# Altium integrated library esd_library.IntLib: 995 symbols (part 3 of 6) (continued)
## Resistor_2.74R (continued)
RES SMD 2.74R OHM 1% 1/8W 0805; MPN: CRCW08052R74FKEA; Name: Resistor_2.74R; PN: 541-2.74CCCT-ND; URL: http://www.digikey.ca/product-detail/en/CRCW08052R74FKEA/541-2.74CCCT-ND
footprint RESC2112X05M (Chip Resistor, 2-Leads, Body 2.05x1.25mm, IPC Low Density)
pins: 1, 2

## Resistor_2.80K
designator R?, comment Res3  value 2.80K
RES SMD 2.80K OHM 1% 1/8W 0805; MPN: CRCW08052K80FKEA; Name: Resistor_2.80K; PN: 541-2.80KCCT-ND; URL: http://www.digikey.ca/product-detail/en/CRCW08052K80FKEA/541-2.80KCCT-ND
footprint RESC2112X05M (Chip Resistor, 2-Leads, Body 2.05x1.25mm, IPC Low Density)
pins: 1, 2

## Resistor_2.80M
designator R?, comment Res3  value 2.80M
RES SMD 2.80M OHM 1% 1/8W 0805; MPN: CRCW08052M80FKEA; Name: Resistor_2.80M; PN: 541-2.80MCCT-ND; URL: http://www.digikey.ca/product-detail/en/CRCW08052M80FKEA/541-2.80MCCT-ND
footprint RESC2112X05M (Chip Resistor, 2-Leads, Body 2.05x1.25mm, IPC Low Density)
pins: 1, 2

## Resistor_2.80R
designator R?, comment Res3  value 2.80R
RES SMD 2.80R OHM 1% 1/8W 0805; MPN: CRCW08052R80FKEA; Name: Resistor_2.80R; PN: 541-2.80CCCT-ND; URL: http://www.digikey.ca/product-detail/en/CRCW08052R80FKEA/541-2.80CCCT-ND
footprint RESC2112X05M (Chip Resistor, 2-Leads, Body 2.05x1.25mm, IPC Low Density)
pins: 1, 2

## Resistor_2.87K
designator R?, comment Res3  value 2.87K
RES SMD 2.87K OHM 1% 1/8W 0805; MPN: CRCW08052K87FKEA; Name: Resistor_2.87K; PN: 541-2.87KCCT-ND; URL: http://www.digikey.ca/product-detail/en/CRCW08052K87FKEA/541-2.87KCCT-ND
footprint RESC2112X05M (Chip Resistor, 2-Leads, Body 2.05x1.25mm, IPC Low Density)
pins: 1, 2

## Resistor_2.87M
designator R?, comment Res3  value 2.87M
RES SMD 2.87M OHM 1% 1/8W 0805; MPN: CRCW08052M87FKEA; Name: Resistor_2.87M; PN: 541-2.87MCCT-ND; URL: http://www.digikey.ca/product-detail/en/CRCW08052M87FKEA/541-2.87MCCT-ND
footprint RESC2112X05M (Chip Resistor, 2-Leads, Body 2.05x1.25mm, IPC Low Density)
pins: 1, 2

## Resistor_2.87R
designator R?, comment Res3  value 2.87R
RES SMD 2.87R OHM 1% 1/8W 0805; MPN: CRCW08052R87FKEA; Name: Resistor_2.87R; PN: 541-2.87CCCT-ND; URL: http://www.digikey.ca/product-detail/en/CRCW08052R87FKEA/541-2.87CCCT-ND
footprint RESC2112X05M (Chip Resistor, 2-Leads, Body 2.05x1.25mm, IPC Low Density)
pins: 1, 2

## Resistor_2.94K
designator R?, comment Res3  value 2.94K
RES SMD 2.94K OHM 1% 1/8W 0805; MPN: CRCW08052K94FKEA; Name: Resistor_2.94K; PN: 541-2.94KCCT-ND; URL: http://www.digikey.ca/product-detail/en/CRCW08052K94FKEA/541-2.94KCCT-ND
footprint RESC2112X05M (Chip Resistor, 2-Leads, Body 2.05x1.25mm, IPC Low Density)
pins: 1, 2

## Resistor_2.94M
designator R?, comment Res3  value 2.94M
RES SMD 2.94M OHM 1% 1/8W 0805; MPN: CRCW08052M94FKEA; Name: Resistor_2.94M; PN: 541-2.94MCCT-ND; URL: http://www.digikey.ca/product-detail/en/CRCW08052M94FKEA/541-2.94MCCT-ND
footprint RESC2112X05M (Chip Resistor, 2-Leads, Body 2.05x1.25mm, IPC Low Density)
pins: 1, 2

## Resistor_2.94R
designator R?, comment Res3  value 2.94R
RES SMD 2.94R OHM 1% 1/8W 0805; MPN: CRCW08052R94FKEA; Name: Resistor_2.94R; PN: 541-2.94CCCT-ND; URL: http://www.digikey.ca/product-detail/en/CRCW08052R94FKEA/541-2.94CCCT-ND
footprint RESC2112X05M (Chip Resistor, 2-Leads, Body 2.05x1.25mm, IPC Low Density)
pins: 1, 2

## Resistor_3.01K
designator R?, comment Res3  value 3.01K
RES SMD 3.01K OHM 1% 1/8W 0805; MPN: CRCW08053K01FKEA; Name: Resistor_3.01K; PN: 541-3.01KCCT-ND; URL: http://www.digikey.ca/product-detail/en/CRCW08053K01FKEA/541-3.01KCCT-ND
footprint RESC2112X05M (Chip Resistor, 2-Leads, Body 2.05x1.25mm, IPC Low Density)
pins: 1, 2

## Resistor_3.01M
designator R?, comment Res3  value 3.01M
RES SMD 3.01M OHM 1% 1/8W 0805; MPN: CRCW08053M01FKEA; Name: Resistor_3.01M; PN: 541-3.01MCCT-ND; URL: http://www.digikey.ca/product-detail/en/CRCW08053M01FKEA/541-3.01MCCT-ND
footprint RESC2112X05M (Chip Resistor, 2-Leads, Body 2.05x1.25mm, IPC Low Density)
pins: 1, 2

## Resistor_3.01R
designator R?, comment Res3  value 3.01R
RES SMD 3.01R OHM 1% 1/8W 0805; MPN: CRCW08053R01FKEA; Name: Resistor_3.01R; PN: 541-3.01CCCT-ND; URL: http://www.digikey.ca/product-detail/en/CRCW08053R01FKEA/541-3.01CCCT-ND
footprint RESC2112X05M (Chip Resistor, 2-Leads, Body 2.05x1.25mm, IPC Low Density)
pins: 1, 2

## Resistor_3.09K
designator R?, comment Res3  value 3.09K
RES SMD 3.09K OHM 1% 1/8W 0805; MPN: CRCW08053K09FKEA; Name: Resistor_3.09K; PN: 541-3.09KCCT-ND; URL: http://www.digikey.ca/product-detail/en/CRCW08053K09FKEA/541-3.09KCCT-ND
footprint RESC2112X05M (Chip Resistor, 2-Leads, Body 2.05x1.25mm, IPC Low Density)
pins: 1, 2

## Resistor_3.09M
designator R?, comment Res3  value 3.09M
RES SMD 3.09M OHM 1% 1/8W 0805; MPN: CRCW08053M09FKEA; Name: Resistor_3.09M; PN: 541-3.09MCCT-ND; URL: http://www.digikey.ca/product-detail/en/CRCW08053M09FKEA/541-3.09MCCT-ND
footprint RESC2112X05M (Chip Resistor, 2-Leads, Body 2.05x1.25mm, IPC Low Density)
pins: 1, 2

## Resistor_3.09R
designator R?, comment Res3  value 3.09R
RES SMD 3.09R OHM 1% 1/8W 0805; MPN: CRCW08053R09FKEA; Name: Resistor_3.09R; PN: 541-3.09CCCT-ND; URL: http://www.digikey.ca/product-detail/en/CRCW08053R09FKEA/541-3.09CCCT-ND
footprint RESC2112X05M (Chip Resistor, 2-Leads, Body 2.05x1.25mm, IPC Low Density)
pins: 1, 2

## Resistor_3.16K
designator R?, comment Res3  value 3.16K
RES SMD 3.16K OHM 1% 1/8W 0805; MPN: CRCW08053K16FKEA; Name: Resistor_3.16K; PN: 541-3.16KCCT-ND; URL: http://www.digikey.ca/product-detail/en/CRCW08053K16FKEA/541-3.16KCCT-ND
footprint RESC2112X05M (Chip Resistor, 2-Leads, Body 2.05x1.25mm, IPC Low Density)
pins: 1, 2

## Resistor_3.16M
designator R?, comment Res3  value 3.16M
RES SMD 3.16M OHM 1% 1/8W 0805; MPN: CRCW08053M16FKEA; Name: Resistor_3.16M; PN: 541-3.16MCCT-ND; URL: http://www.digikey.ca/product-detail/en/CRCW08053M16FKEA/541-3.16MCCT-ND
footprint RESC2112X05M (Chip Resistor, 2-Leads, Body 2.05x1.25mm, IPC Low Density)
pins: 1, 2

## Resistor_3.16R
designator R?, comment Res3  value 3.16R
RES SMD 3.16R OHM 1% 1/8W 0805; MPN: CRCW08053R16FKEA; Name: Resistor_3.16R; PN: 541-3.16CCCT-ND; URL: http://www.digikey.ca/product-detail/en/CRCW08053R16FKEA/541-3.16CCCT-ND
footprint RESC2112X05M (Chip Resistor, 2-Leads, Body 2.05x1.25mm, IPC Low Density)
pins: 1, 2

## Resistor_3.24K
designator R?, comment Res3  value 3.24K
RES SMD 3.24K OHM 1% 1/8W 0805; MPN: CRCW08053K24FKEA; Name: Resistor_3.24K; PN: 541-3.24KCCT-ND; URL: http://www.digikey.ca/product-detail/en/CRCW08053K24FKEA/541-3.24KCCT-ND
footprint RESC2112X05M (Chip Resistor, 2-Leads, Body 2.05x1.25mm, IPC Low Density)
pins: 1, 2

## Resistor_3.24M
designator R?, comment Res3  value 3.24M
RES SMD 3.24M OHM 1% 1/8W 0805; MPN: CRCW08053M24FKEA; Name: Resistor_3.24M; PN: 541-3.24MCCT-ND; URL: http://www.digikey.ca/product-detail/en/CRCW08053M24FKEA/541-3.24MCCT-ND
footprint RESC2112X05M (Chip Resistor, 2-Leads, Body 2.05x1.25mm, IPC Low Density)
pins: 1, 2

## Resistor_3.24R
designator R?, comment Res3  value 3.24R
RES SMD 3.24R OHM 1% 1/8W 0805; MPN: CRCW08053R24FKEA; Name: Resistor_3.24R; PN: 541-3.24CCCT-ND; URL: http://www.digikey.ca/product-detail/en/CRCW08053R24FKEA/541-3.24CCCT-ND
footprint RESC2112X05M (Chip Resistor, 2-Leads, Body 2.05x1.25mm, IPC Low Density)
pins: 1, 2

## Resistor_3.32K
designator R?, comment Res3  value 3.32K
RES SMD 3.32K OHM 1% 1/8W 0805; MPN: CRCW08053K32FKEA; Name: Resistor_3.32K; PN: 541-3.32KCCT-ND; URL: http://www.digikey.ca/product-detail/en/CRCW08053K32FKEA/541-3.32KCCT-ND
footprint RESC2112X05M (Chip Resistor, 2-Leads, Body 2.05x1.25mm, IPC Low Density)
pins: 1, 2

## Resistor_3.32M
designator R?, comment Res3  value 3.32M
RES SMD 3.32M OHM 1% 1/8W 0805; MPN: CRCW08053M32FKEA; Name: Resistor_3.32M; PN: 541-3.32MCCT-ND; URL: http://www.digikey.ca/product-detail/en/CRCW08053M32FKEA/541-3.32MCCT-ND
footprint RESC2112X05M (Chip Resistor, 2-Leads, Body 2.05x1.25mm, IPC Low Density)
pins: 1, 2

## Resistor_3.32R
designator R?, comment Res3  value 3.32R
RES SMD 3.32R OHM 1% 1/8W 0805; MPN: CRCW08053R32FKEA; Name: Resistor_3.32R; PN: 541-3.32CCCT-ND; URL: http://www.digikey.ca/product-detail/en/CRCW08053R32FKEA/541-3.32CCCT-ND
footprint RESC2112X05M (Chip Resistor, 2-Leads, Body 2.05x1.25mm, IPC Low Density)
pins: 1, 2

## Resistor_3.40K
designator R?, comment Res3  value 3.40K
RES SMD 3.40K OHM 1% 1/8W 0805; MPN: CRCW08053K40FKEA; Name: Resistor_3.40K; PN: 541-3.40KCCT-ND; URL: http://www.digikey.ca/product-detail/en/CRCW08053K40FKEA/541-3.40KCCT-ND
footprint RESC2112X05M (Chip Resistor, 2-Leads, Body 2.05x1.25mm, IPC Low Density)
pins: 1, 2

## Resistor_3.40M
designator R?, comment Res3  value 3.40M
RES SMD 3.40M OHM 1% 1/8W 0805; MPN: CRCW08053M40FKEA; Name: Resistor_3.40M; PN: 541-3.40MCCT-ND; URL: http://www.digikey.ca/product-detail/en/CRCW08053M40FKEA/541-3.40MCCT-ND
footprint RESC2112X05M (Chip Resistor, 2-Leads, Body 2.05x1.25mm, IPC Low Density)
pins: 1, 2

## Resistor_3.40R
designator R?, comment Res3  value 3.40R
RES SMD 3.40R OHM 1% 1/8W 0805; MPN: CRCW08053R40FKEA; Name: Resistor_3.40R; PN: 541-3.40CCCT-ND; URL: http://www.digikey.ca/product-detail/en/CRCW08053R40FKEA/541-3.40CCCT-ND
footprint RESC2112X05M (Chip Resistor, 2-Leads, Body 2.05x1.25mm, IPC Low Density)
pins: 1, 2

## Resistor_3.48K
designator R?, comment Res3  value 3.48K
RES SMD 3.48K OHM 1% 1/8W 0805; MPN: CRCW08053K48FKEA; Name: Resistor_3.48K; PN: 541-3.48KCCT-ND; URL: http://www.digikey.ca/product-detail/en/CRCW08053K48FKEA/541-3.48KCCT-ND
footprint RESC2112X05M (Chip Resistor, 2-Leads, Body 2.05x1.25mm, IPC Low Density)
pins: 1, 2

## Resistor_3.48M
designator R?, comment Res3  value 3.48M
RES SMD 3.48M OHM 1% 1/8W 0805; MPN: CRCW08053M48FKEA; Name: Resistor_3.48M; PN: 541-3.48MCCT-ND; URL: http://www.digikey.ca/product-detail/en/CRCW08053M48FKEA/541-3.48MCCT-ND
footprint RESC2112X05M (Chip Resistor, 2-Leads, Body 2.05x1.25mm, IPC Low Density)
pins: 1, 2

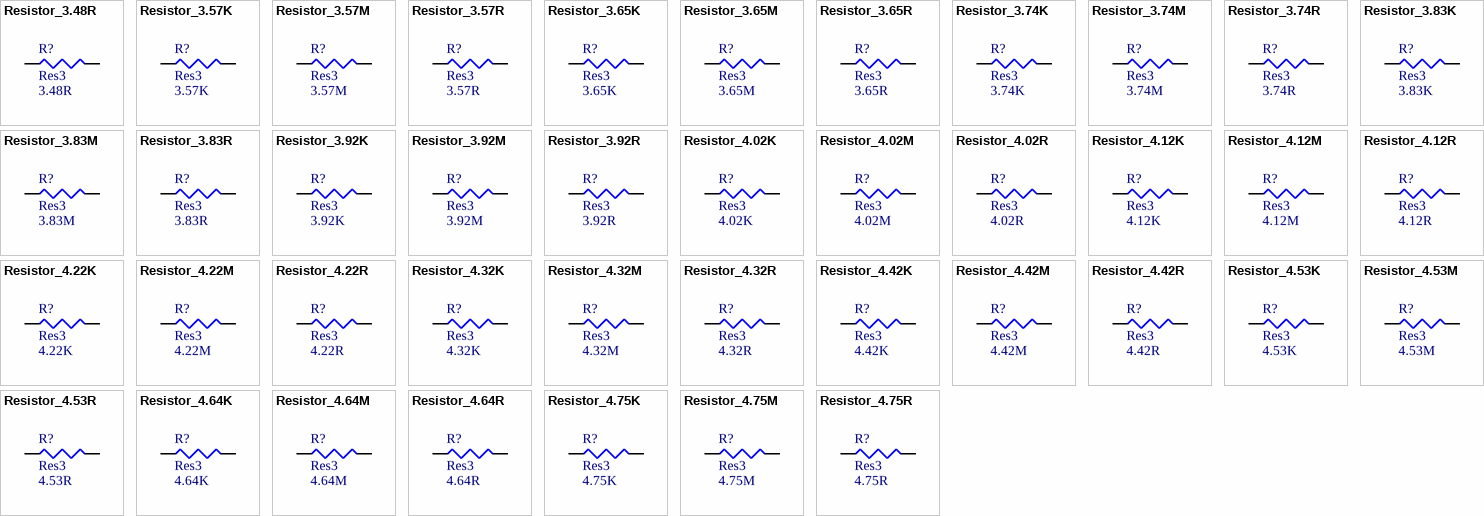
[diagram p15: symbols Resistor_3.48R to Resistor_4.75R]

## Resistor_3.48R
designator R?, comment Res3  value 3.48R
RES SMD 3.48R OHM 1% 1/8W 0805; MPN: CRCW08053R48FKEA; Name: Resistor_3.48R; PN: 541-3.48CCCT-ND; URL: http://www.digikey.ca/product-detail/en/CRCW08053R48FKEA/541-3.48CCCT-ND
footprint RESC2112X05M (Chip Resistor, 2-Leads, Body 2.05x1.25mm, IPC Low Density)
pins: 1, 2

## Resistor_3.57K
designator R?, comment Res3  value 3.57K
RES SMD 3.57K OHM 1% 1/8W 0805; MPN: CRCW08053K57FKEA; Name: Resistor_3.57K; PN: 541-3.57KCCT-ND; URL: http://www.digikey.ca/product-detail/en/CRCW08053K57FKEA/541-3.57KCCT-ND
footprint RESC2112X05M (Chip Resistor, 2-Leads, Body 2.05x1.25mm, IPC Low Density)
pins: 1, 2

## Resistor_3.57M
designator R?, comment Res3  value 3.57M
RES SMD 3.57M OHM 1% 1/8W 0805; MPN: CRCW08053M57FKEA; Name: Resistor_3.57M; PN: 541-3.57MCCT-ND; URL: http://www.digikey.ca/product-detail/en/CRCW08053M57FKEA/541-3.57MCCT-ND
footprint RESC2112X05M (Chip Resistor, 2-Leads, Body 2.05x1.25mm, IPC Low Density)
pins: 1, 2

## Resistor_3.57R
designator R?, comment Res3  value 3.57R
RES SMD 3.57R OHM 1% 1/8W 0805; MPN: CRCW08053R57FKEA; Name: Resistor_3.57R; PN: 541-3.57CCCT-ND; URL: http://www.digikey.ca/product-detail/en/CRCW08053R57FKEA/541-3.57CCCT-ND
footprint RESC2112X05M (Chip Resistor, 2-Leads, Body 2.05x1.25mm, IPC Low Density)
pins: 1, 2

## Resistor_3.65K
designator R?, comment Res3  value 3.65K
RES SMD 3.65K OHM 1% 1/8W 0805; MPN: CRCW08053K65FKEA; Name: Resistor_3.65K; PN: 541-3.65KCCT-ND; URL: http://www.digikey.ca/product-detail/en/CRCW08053K65FKEA/541-3.65KCCT-ND
footprint RESC2112X05M (Chip Resistor, 2-Leads, Body 2.05x1.25mm, IPC Low Density)
pins: 1, 2

## Resistor_3.65M
designator R?, comment Res3  value 3.65M
RES SMD 3.65M OHM 1% 1/8W 0805; MPN: CRCW08053M65FKEA; Name: Resistor_3.65M; PN: 541-3.65MCCT-ND; URL: http://www.digikey.ca/product-detail/en/CRCW08053M65FKEA/541-3.65MCCT-ND
footprint RESC2112X05M (Chip Resistor, 2-Leads, Body 2.05x1.25mm, IPC Low Density)
pins: 1, 2

## Resistor_3.65R
designator R?, comment Res3  value 3.65R
RES SMD 3.65R OHM 1% 1/8W 0805; MPN: CRCW08053R65FKEA; Name: Resistor_3.65R; PN: 541-3.65CCCT-ND; URL: http://www.digikey.ca/product-detail/en/CRCW08053R65FKEA/541-3.65CCCT-ND
footprint RESC2112X05M (Chip Resistor, 2-Leads, Body 2.05x1.25mm, IPC Low Density)
pins: 1, 2

## Resistor_3.74K
designator R?, comment Res3  value 3.74K
RES SMD 3.74K OHM 1% 1/8W 0805; MPN: CRCW08053K74FKEA; Name: Resistor_3.74K; PN: 541-3.74KCCT-ND; URL: http://www.digikey.ca/product-detail/en/CRCW08053K74FKEA/541-3.74KCCT-ND
footprint RESC2112X05M (Chip Resistor, 2-Leads, Body 2.05x1.25mm, IPC Low Density)
pins: 1, 2

## Resistor_3.74M
designator R?, comment Res3  value 3.74M
RES SMD 3.74M OHM 1% 1/8W 0805; MPN: CRCW08053M74FKEA; Name: Resistor_3.74M; PN: 541-3.74MCCT-ND; URL: http://www.digikey.ca/product-detail/en/CRCW08053M74FKEA/541-3.74MCCT-ND
footprint RESC2112X05M (Chip Resistor, 2-Leads, Body 2.05x1.25mm, IPC Low Density)
pins: 1, 2

## Resistor_3.74R
designator R?, comment Res3  value 3.74R
RES SMD 3.74R OHM 1% 1/8W 0805; MPN: CRCW08053R74FKEA; Name: Resistor_3.74R; PN: 541-3.74CCCT-ND; URL: http://www.digikey.ca/product-detail/en/CRCW08053R74FKEA/541-3.74CCCT-ND
footprint RESC2112X05M (Chip Resistor, 2-Leads, Body 2.05x1.25mm, IPC Low Density)
pins: 1, 2

## Resistor_3.83K
designator R?, comment Res3  value 3.83K
RES SMD 3.83K OHM 1% 1/8W 0805; MPN: CRCW08053K83FKEA; Name: Resistor_3.83K; PN: 541-3.83KCCT-ND; URL: http://www.digikey.ca/product-detail/en/CRCW08053K83FKEA/541-3.83KCCT-ND
footprint RESC2112X05M (Chip Resistor, 2-Leads, Body 2.05x1.25mm, IPC Low Density)
pins: 1, 2

## Resistor_3.83M
designator R?, comment Res3  value 3.83M
RES SMD 3.83M OHM 1% 1/8W 0805; MPN: CRCW08053M83FKEA; Name: Resistor_3.83M; PN: 541-3.83MCCT-ND; URL: http://www.digikey.ca/product-detail/en/CRCW08053M83FKEA/541-3.83MCCT-ND
footprint RESC2112X05M (Chip Resistor, 2-Leads, Body 2.05x1.25mm, IPC Low Density)
pins: 1, 2

## Resistor_3.83R
designator R?, comment Res3  value 3.83R
RES SMD 3.83R OHM 1% 1/8W 0805; MPN: CRCW08053R83FKEA; Name: Resistor_3.83R; PN: 541-3.83CCCT-ND; URL: http://www.digikey.ca/product-detail/en/CRCW08053R83FKEA/541-3.83CCCT-ND
footprint RESC2112X05M (Chip Resistor, 2-Leads, Body 2.05x1.25mm, IPC Low Density)
pins: 1, 2

## Resistor_3.92K
designator R?, comment Res3  value 3.92K
RES SMD 3.92K OHM 1% 1/8W 0805; MPN: CRCW08053K92FKEA; Name: Resistor_3.92K; PN: 541-3.92KCCT-ND; URL: http://www.digikey.ca/product-detail/en/CRCW08053K92FKEA/541-3.92KCCT-ND
footprint RESC2112X05M (Chip Resistor, 2-Leads, Body 2.05x1.25mm, IPC Low Density)
pins: 1, 2

## Resistor_3.92M
designator R?, comment Res3  value 3.92M
RES SMD 3.92M OHM 1% 1/8W 0805; MPN: CRCW08053M92FKEA; Name: Resistor_3.92M; PN: 541-3.92MCCT-ND; URL: http://www.digikey.ca/product-detail/en/CRCW08053M92FKEA/541-3.92MCCT-ND
footprint RESC2112X05M (Chip Resistor, 2-Leads, Body 2.05x1.25mm, IPC Low Density)
pins: 1, 2

## Resistor_3.92R
designator R?, comment Res3  value 3.92R
RES SMD 3.92R OHM 1% 1/8W 0805; MPN: CRCW08053R92FKEA; Name: Resistor_3.92R; PN: 541-3.92CCCT-ND; URL: http://www.digikey.ca/product-detail/en/CRCW08053R92FKEA/541-3.92CCCT-ND
footprint RESC2112X05M (Chip Resistor, 2-Leads, Body 2.05x1.25mm, IPC Low Density)
pins: 1, 2

## Resistor_4.02K
designator R?, comment Res3  value 4.02K
RES SMD 4.02K OHM 1% 1/8W 0805; MPN: CRCW08054K02FKEA; Name: Resistor_4.02K; PN: 541-4.02KCCT-ND; URL: http://www.digikey.ca/product-detail/en/CRCW08054K02FKEA/541-4.02KCCT-ND
footprint RESC2112X05M (Chip Resistor, 2-Leads, Body 2.05x1.25mm, IPC Low Density)
pins: 1, 2

## Resistor_4.02M
designator R?, comment Res3  value 4.02M
RES SMD 4.02M OHM 1% 1/8W 0805; MPN: CRCW08054M02FKEA; Name: Resistor_4.02M; PN: 541-4.02MCCT-ND; URL: http://www.digikey.ca/product-detail/en/CRCW08054M02FKEA/541-4.02MCCT-ND
footprint RESC2112X05M (Chip Resistor, 2-Leads, Body 2.05x1.25mm, IPC Low Density)
pins: 1, 2

## Resistor_4.02R
designator R?, comment Res3  value 4.02R
RES SMD 4.02R OHM 1% 1/8W 0805; MPN: CRCW08054R02FKEA; Name: Resistor_4.02R; PN: 541-4.02CCCT-ND; URL: http://www.digikey.ca/product-detail/en/CRCW08054R02FKEA/541-4.02CCCT-ND
footprint RESC2112X05M (Chip Resistor, 2-Leads, Body 2.05x1.25mm, IPC Low Density)
pins: 1, 2

## Resistor_4.12K
designator R?, comment Res3  value 4.12K
RES SMD 4.12K OHM 1% 1/8W 0805; MPN: CRCW08054K12FKEA; Name: Resistor_4.12K; PN: 541-4.12KCCT-ND; URL: http://www.digikey.ca/product-detail/en/CRCW08054K12FKEA/541-4.12KCCT-ND
footprint RESC2112X05M (Chip Resistor, 2-Leads, Body 2.05x1.25mm, IPC Low Density)
pins: 1, 2

## Resistor_4.12M
designator R?, comment Res3  value 4.12M
RES SMD 4.12M OHM 1% 1/8W 0805; MPN: CRCW08054M12FKEA; Name: Resistor_4.12M; PN: 541-4.12MCCT-ND; URL: http://www.digikey.ca/product-detail/en/CRCW08054M12FKEA/541-4.12MCCT-ND
footprint RESC2112X05M (Chip Resistor, 2-Leads, Body 2.05x1.25mm, IPC Low Density)
pins: 1, 2

## Resistor_4.12R
designator R?, comment Res3  value 4.12R
RES SMD 4.12R OHM 1% 1/8W 0805; MPN: CRCW08054R12FKEA; Name: Resistor_4.12R; PN: 541-4.12CCCT-ND; URL: http://www.digikey.ca/product-detail/en/CRCW08054R12FKEA/541-4.12CCCT-ND
footprint RESC2112X05M (Chip Resistor, 2-Leads, Body 2.05x1.25mm, IPC Low Density)
pins: 1, 2

## Resistor_4.22K
designator R?, comment Res3  value 4.22K
RES SMD 4.22K OHM 1% 1/8W 0805; MPN: CRCW08054K22FKEA; Name: Resistor_4.22K; PN: 541-4.22KCCT-ND; URL: http://www.digikey.ca/product-detail/en/CRCW08054K22FKEA/541-4.22KCCT-ND
footprint RESC2112X05M (Chip Resistor, 2-Leads, Body 2.05x1.25mm, IPC Low Density)
pins: 1, 2

## Resistor_4.22M
designator R?, comment Res3  value 4.22M
RES SMD 4.22M OHM 1% 1/8W 0805; MPN: CRCW08054M22FKEA; Name: Resistor_4.22M; PN: 541-4.22MCCT-ND; URL: http://www.digikey.ca/product-detail/en/CRCW08054M22FKEA/541-4.22MCCT-ND
footprint RESC2112X05M (Chip Resistor, 2-Leads, Body 2.05x1.25mm, IPC Low Density)
pins: 1, 2

## Resistor_4.22R
designator R?, comment Res3  value 4.22R
RES SMD 4.22R OHM 1% 1/8W 0805; MPN: CRCW08054R22FKEA; Name: Resistor_4.22R; PN: 541-4.22CCCT-ND; URL: http://www.digikey.ca/product-detail/en/CRCW08054R22FKEA/541-4.22CCCT-ND
footprint RESC2112X05M (Chip Resistor, 2-Leads, Body 2.05x1.25mm, IPC Low Density)
pins: 1, 2

## Resistor_4.32K
designator R?, comment Res3  value 4.32K
RES SMD 4.32K OHM 1% 1/8W 0805; MPN: CRCW08054K32FKEA; Name: Resistor_4.32K; PN: 541-4.32KCCT-ND; URL: http://www.digikey.ca/product-detail/en/CRCW08054K32FKEA/541-4.32KCCT-ND
footprint RESC2112X05M (Chip Resistor, 2-Leads, Body 2.05x1.25mm, IPC Low Density)
pins: 1, 2

## Resistor_4.32M
designator R?, comment Res3  value 4.32M
RES SMD 4.32M OHM 1% 1/8W 0805; MPN: CRCW08054M32FKEA; Name: Resistor_4.32M; PN: 541-4.32MCCT-ND; URL: http://www.digikey.ca/product-detail/en/CRCW08054M32FKEA/541-4.32MCCT-ND
footprint RESC2112X05M (Chip Resistor, 2-Leads, Body 2.05x1.25mm, IPC Low Density)
pins: 1, 2

## Resistor_4.32R
designator R?, comment Res3  value 4.32R
RES SMD 4.32R OHM 1% 1/8W 0805; MPN: CRCW08054R32FKEA; Name: Resistor_4.32R; PN: 541-4.32CCCT-ND; URL: http://www.digikey.ca/product-detail/en/CRCW08054R32FKEA/541-4.32CCCT-ND
footprint RESC2112X05M (Chip Resistor, 2-Leads, Body 2.05x1.25mm, IPC Low Density)
pins: 1, 2

## Resistor_4.42K
designator R?, comment Res3  value 4.42K
RES SMD 4.42K OHM 1% 1/8W 0805; MPN: CRCW08054K42FKEA; Name: Resistor_4.42K; PN: 541-4.42KCCT-ND; URL: http://www.digikey.ca/product-detail/en/CRCW08054K42FKEA/541-4.42KCCT-ND
footprint RESC2112X05M (Chip Resistor, 2-Leads, Body 2.05x1.25mm, IPC Low Density)
pins: 1, 2

## Resistor_4.42M
designator R?, comment Res3  value 4.42M
RES SMD 4.42M OHM 1% 1/8W 0805; MPN: CRCW08054M42FKEA; Name: Resistor_4.42M; PN: 541-4.42MCCT-ND; URL: http://www.digikey.ca/product-detail/en/CRCW08054M42FKEA/541-4.42MCCT-ND
footprint RESC2112X05M (Chip Resistor, 2-Leads, Body 2.05x1.25mm, IPC Low Density)
pins: 1, 2

## Resistor_4.42R
designator R?, comment Res3  value 4.42R
RES SMD 4.42R OHM 1% 1/8W 0805; MPN: CRCW08054R42FKEA; Name: Resistor_4.42R; PN: 541-4.42CCCT-ND; URL: http://www.digikey.ca/product-detail/en/CRCW08054R42FKEA/541-4.42CCCT-ND
footprint RESC2112X05M (Chip Resistor, 2-Leads, Body 2.05x1.25mm, IPC Low Density)
pins: 1, 2

## Resistor_4.53K
designator R?, comment Res3  value 4.53K
RES SMD 4.53K OHM 1% 1/8W 0805; MPN: CRCW08054K53FKEA; Name: Resistor_4.53K; PN: 541-4.53KCCT-ND; URL: http://www.digikey.ca/product-detail/en/CRCW08054K53FKEA/541-4.53KCCT-ND
footprint RESC2112X05M (Chip Resistor, 2-Leads, Body 2.05x1.25mm, IPC Low Density)
pins: 1, 2

## Resistor_4.53M
designator R?, comment Res3  value 4.53M
RES SMD 4.53M OHM 1% 1/8W 0805; MPN: CRCW08054M53FKEA; Name: Resistor_4.53M; PN: 541-4.53MCCT-ND; URL: http://www.digikey.ca/product-detail/en/CRCW08054M53FKEA/541-4.53MCCT-ND
footprint RESC2112X05M (Chip Resistor, 2-Leads, Body 2.05x1.25mm, IPC Low Density)
pins: 1, 2

## Resistor_4.53R
designator R?, comment Res3  value 4.53R
RES SMD 4.53R OHM 1% 1/8W 0805; MPN: CRCW08054R53FKEA; Name: Resistor_4.53R; PN: 541-4.53CCCT-ND; URL: http://www.digikey.ca/product-detail/en/CRCW08054R53FKEA/541-4.53CCCT-ND
footprint RESC2112X05M (Chip Resistor, 2-Leads, Body 2.05x1.25mm, IPC Low Density)
pins: 1, 2

## Resistor_4.64K
designator R?, comment Res3  value 4.64K
RES SMD 4.64K OHM 1% 1/8W 0805; MPN: CRCW08054K64FKEA; Name: Resistor_4.64K; PN: 541-4.64KCCT-ND; URL: http://www.digikey.ca/product-detail/en/CRCW08054K64FKEA/541-4.64KCCT-ND
footprint RESC2112X05M (Chip Resistor, 2-Leads, Body 2.05x1.25mm, IPC Low Density)
pins: 1, 2

## Resistor_4.64M
designator R?, comment Res3  value 4.64M
RES SMD 4.64M OHM 1% 1/8W 0805; MPN: CRCW08054M64FKEA; Name: Resistor_4.64M; PN: 541-4.64MCCT-ND; URL: http://www.digikey.ca/product-detail/en/CRCW08054M64FKEA/541-4.64MCCT-ND
footprint RESC2112X05M (Chip Resistor, 2-Leads, Body 2.05x1.25mm, IPC Low Density)
pins: 1, 2

## Resistor_4.64R
designator R?, comment Res3  value 4.64R
RES SMD 4.64R OHM 1% 1/8W 0805; MPN: CRCW08054R64FKEA; Name: Resistor_4.64R; PN: 541-4.64CCCT-ND; URL: http://www.digikey.ca/product-detail/en/CRCW08054R64FKEA/541-4.64CCCT-ND
footprint RESC2112X05M (Chip Resistor, 2-Leads, Body 2.05x1.25mm, IPC Low Density)
pins: 1, 2

## Resistor_4.75K
designator R?, comment Res3  value 4.75K
RES SMD 4.75K OHM 1% 1/8W 0805; MPN: CRCW08054K75FKEA; Name: Resistor_4.75K; PN: 541-4.75KCCT-ND; URL: http://www.digikey.ca/product-detail/en/CRCW08054K75FKEA/541-4.75KCCT-ND
footprint RESC2112X05M (Chip Resistor, 2-Leads, Body 2.05x1.25mm, IPC Low Density)
pins: 1, 2

## Resistor_4.75M
designator R?, comment Res3  value 4.75M
RES SMD 4.75M OHM 1% 1/8W 0805; MPN: CRCW08054M75FKEA; Name: Resistor_4.75M; PN: 541-4.75MCCT-ND; URL: http://www.digikey.ca/product-detail/en/CRCW08054M75FKEA/541-4.75MCCT-ND
footprint RESC2112X05M (Chip Resistor, 2-Leads, Body 2.05x1.25mm, IPC Low Density)
pins: 1, 2

## Resistor_4.75R
designator R?, comment Res3  value 4.75R
RES SMD 4.75R OHM 1% 1/8W 0805; MPN: CRCW08054R75FKEA; Name: Resistor_4.75R; PN: 541-4.75CCCT-ND; URL: http://www.digikey.ca/product-detail/en/CRCW08054R75FKEA/541-4.75CCCT-ND
footprint RESC2112X05M (Chip Resistor, 2-Leads, Body 2.05x1.25mm, IPC Low Density)
pins: 1, 2

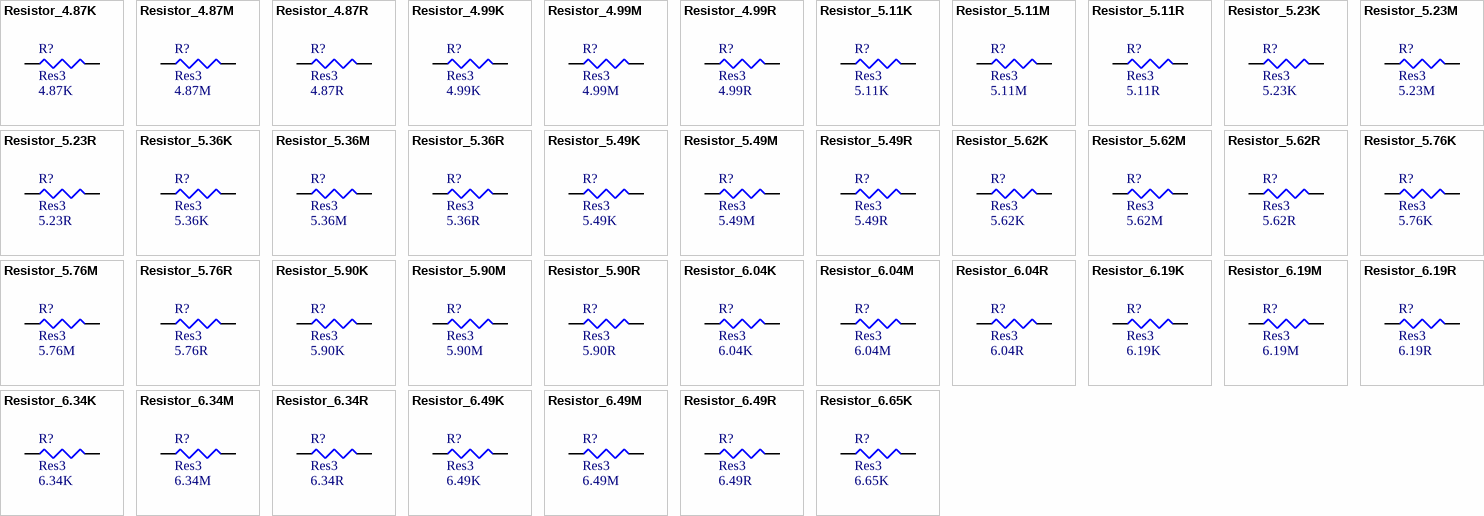
[diagram p16: symbols Resistor_4.87K to Resistor_6.65K]

## Resistor_4.87K
designator R?, comment Res3  value 4.87K
RES SMD 4.87K OHM 1% 1/8W 0805; MPN: CRCW08054K87FKEA; Name: Resistor_4.87K; PN: 541-4.87KCCT-ND; URL: http://www.digikey.ca/product-detail/en/CRCW08054K87FKEA/541-4.87KCCT-ND
footprint RESC2112X05M (Chip Resistor, 2-Leads, Body 2.05x1.25mm, IPC Low Density)
pins: 1, 2

## Resistor_4.87M
designator R?, comment Res3  value 4.87M
RES SMD 4.87M OHM 1% 1/8W 0805; MPN: CRCW08054M87FKEA; Name: Resistor_4.87M; PN: 541-4.87MCCT-ND; URL: http://www.digikey.ca/product-detail/en/CRCW08054M87FKEA/541-4.87MCCT-ND
footprint RESC2112X05M (Chip Resistor, 2-Leads, Body 2.05x1.25mm, IPC Low Density)
pins: 1, 2

## Resistor_4.87R
designator R?, comment Res3  value 4.87R
RES SMD 4.87R OHM 1% 1/8W 0805; MPN: CRCW08054R87FKEA; Name: Resistor_4.87R; PN: 541-4.87CCCT-ND; URL: http://www.digikey.ca/product-detail/en/CRCW08054R87FKEA/541-4.87CCCT-ND
footprint RESC2112X05M (Chip Resistor, 2-Leads, Body 2.05x1.25mm, IPC Low Density)
pins: 1, 2

## Resistor_4.99K
designator R?, comment Res3  value 4.99K
RES SMD 4.99K OHM 1% 1/8W 0805; MPN: CRCW08054K99FKEA; Name: Resistor_4.99K; PN: 541-4.99KCCT-ND; URL: http://www.digikey.ca/product-detail/en/CRCW08054K99FKEA/541-4.99KCCT-ND
footprint RESC2112X05M (Chip Resistor, 2-Leads, Body 2.05x1.25mm, IPC Low Density)
pins: 1, 2

## Resistor_4.99M
designator R?, comment Res3  value 4.99M
RES SMD 4.99M OHM 1% 1/8W 0805; MPN: CRCW08054M99FKEA; Name: Resistor_4.99M; PN: 541-4.99MCCT-ND; URL: http://www.digikey.ca/product-detail/en/CRCW08054M99FKEA/541-4.99MCCT-ND
footprint RESC2112X05M (Chip Resistor, 2-Leads, Body 2.05x1.25mm, IPC Low Density)
pins: 1, 2

## Resistor_4.99R
designator R?, comment Res3  value 4.99R
RES SMD 4.99R OHM 1% 1/8W 0805; MPN: CRCW08054R99FKEA; Name: Resistor_4.99R; PN: 541-4.99CCCT-ND; URL: http://www.digikey.ca/product-detail/en/CRCW08054R99FKEA/541-4.99CCCT-ND
footprint RESC2112X05M (Chip Resistor, 2-Leads, Body 2.05x1.25mm, IPC Low Density)
pins: 1, 2

## Resistor_5.11K
designator R?, comment Res3  value 5.11K
RES SMD 5.11K OHM 1% 1/8W 0805; MPN: CRCW08055K11FKEA; Name: Resistor_5.11K; PN: 541-5.11KCCT-ND; URL: http://www.digikey.ca/product-detail/en/CRCW08055K11FKEA/541-5.11KCCT-ND
footprint RESC2112X05M (Chip Resistor, 2-Leads, Body 2.05x1.25mm, IPC Low Density)
pins: 1, 2

## Resistor_5.11M
designator R?, comment Res3  value 5.11M
RES SMD 5.11M OHM 1% 1/8W 0805; MPN: CRCW08055M11FKEA; Name: Resistor_5.11M; PN: 541-5.11MCCT-ND; URL: http://www.digikey.ca/product-detail/en/CRCW08055M11FKEA/541-5.11MCCT-ND
footprint RESC2112X05M (Chip Resistor, 2-Leads, Body 2.05x1.25mm, IPC Low Density)
pins: 1, 2

## Resistor_5.11R
designator R?, comment Res3  value 5.11R
RES SMD 5.11R OHM 1% 1/8W 0805; MPN: CRCW08055R11FKEA; Name: Resistor_5.11R; PN: 541-5.11CCCT-ND; URL: http://www.digikey.ca/product-detail/en/CRCW08055R11FKEA/541-5.11CCCT-ND
footprint RESC2112X05M (Chip Resistor, 2-Leads, Body 2.05x1.25mm, IPC Low Density)
pins: 1, 2

## Resistor_5.23K
designator R?, comment Res3  value 5.23K
RES SMD 5.23K OHM 1% 1/8W 0805; MPN: CRCW08055K23FKEA; Name: Resistor_5.23K; PN: 541-5.23KCCT-ND; URL: http://www.digikey.ca/product-detail/en/CRCW08055K23FKEA/541-5.23KCCT-ND
footprint RESC2112X05M (Chip Resistor, 2-Leads, Body 2.05x1.25mm, IPC Low Density)
pins: 1, 2

## Resistor_5.23M
designator R?, comment Res3  value 5.23M
RES SMD 5.23M OHM 1% 1/8W 0805; MPN: CRCW08055M23FKEA; Name: Resistor_5.23M; PN: 541-5.23MCCT-ND; URL: http://www.digikey.ca/product-detail/en/CRCW08055M23FKEA/541-5.23MCCT-ND
footprint RESC2112X05M (Chip Resistor, 2-Leads, Body 2.05x1.25mm, IPC Low Density)
pins: 1, 2

## Resistor_5.23R
designator R?, comment Res3  value 5.23R
RES SMD 5.23R OHM 1% 1/8W 0805; MPN: CRCW08055R23FKEA; Name: Resistor_5.23R; PN: 541-5.23CCCT-ND; URL: http://www.digikey.ca/product-detail/en/CRCW08055R23FKEA/541-5.23CCCT-ND
footprint RESC2112X05M (Chip Resistor, 2-Leads, Body 2.05x1.25mm, IPC Low Density)
pins: 1, 2

## Resistor_5.36K
designator R?, comment Res3  value 5.36K
RES SMD 5.36K OHM 1% 1/8W 0805; MPN: CRCW08055K36FKEA; Name: Resistor_5.36K; PN: 541-5.36KCCT-ND; URL: http://www.digikey.ca/product-detail/en/CRCW08055K36FKEA/541-5.36KCCT-ND
footprint RESC2112X05M (Chip Resistor, 2-Leads, Body 2.05x1.25mm, IPC Low Density)
pins: 1, 2

## Resistor_5.36M
designator R?, comment Res3  value 5.36M
RES SMD 5.36M OHM 1% 1/8W 0805; MPN: CRCW08055M36FKEA; Name: Resistor_5.36M; PN: 541-5.36MCCT-ND; URL: http://www.digikey.ca/product-detail/en/CRCW08055M36FKEA/541-5.36MCCT-ND
footprint RESC2112X05M (Chip Resistor, 2-Leads, Body 2.05x1.25mm, IPC Low Density)
pins: 1, 2

## Resistor_5.36R
designator R?, comment Res3  value 5.36R
RES SMD 5.36R OHM 1% 1/8W 0805; MPN: CRCW08055R36FKEA; Name: Resistor_5.36R; PN: 541-5.36CCCT-ND; URL: http://www.digikey.ca/product-detail/en/CRCW08055R36FKEA/541-5.36CCCT-ND
footprint RESC2112X05M (Chip Resistor, 2-Leads, Body 2.05x1.25mm, IPC Low Density)
pins: 1, 2

## Resistor_5.49K
designator R?, comment Res3  value 5.49K
RES SMD 5.49K OHM 1% 1/8W 0805; MPN: CRCW08055K49FKEA; Name: Resistor_5.49K; PN: 541-5.49KCCT-ND; URL: http://www.digikey.ca/product-detail/en/CRCW08055K49FKEA/541-5.49KCCT-ND
footprint RESC2112X05M (Chip Resistor, 2-Leads, Body 2.05x1.25mm, IPC Low Density)
pins: 1, 2

## Resistor_5.49M
designator R?, comment Res3  value 5.49M
RES SMD 5.49M OHM 1% 1/8W 0805; MPN: CRCW08055M49FKEA; Name: Resistor_5.49M; PN: 541-5.49MCCT-ND; URL: http://www.digikey.ca/product-detail/en/CRCW08055M49FKEA/541-5.49MCCT-ND
footprint RESC2112X05M (Chip Resistor, 2-Leads, Body 2.05x1.25mm, IPC Low Density)
pins: 1, 2

## Resistor_5.49R
designator R?, comment Res3  value 5.49R
RES SMD 5.49R OHM 1% 1/8W 0805; MPN: CRCW08055R49FKEA; Name: Resistor_5.49R; PN: 541-5.49CCCT-ND; URL: http://www.digikey.ca/product-detail/en/CRCW08055R49FKEA/541-5.49CCCT-ND
footprint RESC2112X05M (Chip Resistor, 2-Leads, Body 2.05x1.25mm, IPC Low Density)
pins: 1, 2

## Resistor_5.62K
designator R?, comment Res3  value 5.62K
RES SMD 5.62K OHM 1% 1/8W 0805; MPN: CRCW08055K62FKEA; Name: Resistor_5.62K; PN: 541-5.62KCCT-ND; URL: http://www.digikey.ca/product-detail/en/CRCW08055K62FKEA/541-5.62KCCT-ND
footprint RESC2112X05M (Chip Resistor, 2-Leads, Body 2.05x1.25mm, IPC Low Density)
pins: 1, 2

## Resistor_5.62M
designator R?, comment Res3  value 5.62M
RES SMD 5.62M OHM 1% 1/8W 0805; MPN: CRCW08055M62FKEA; Name: Resistor_5.62M; PN: 541-5.62MCCT-ND; URL: http://www.digikey.ca/product-detail/en/CRCW08055M62FKEA/541-5.62MCCT-ND
footprint RESC2112X05M (Chip Resistor, 2-Leads, Body 2.05x1.25mm, IPC Low Density)
pins: 1, 2

## Resistor_5.62R
designator R?, comment Res3  value 5.62R
RES SMD 5.62R OHM 1% 1/8W 0805; MPN: CRCW08055R62FKEA; Name: Resistor_5.62R; PN: 541-5.62CCCT-ND; URL: http://www.digikey.ca/product-detail/en/CRCW08055R62FKEA/541-5.62CCCT-ND
footprint RESC2112X05M (Chip Resistor, 2-Leads, Body 2.05x1.25mm, IPC Low Density)
pins: 1, 2

## Resistor_5.76K
designator R?, comment Res3  value 5.76K
RES SMD 5.76K OHM 1% 1/8W 0805; MPN: CRCW08055K76FKEA; Name: Resistor_5.76K; PN: 541-5.76KCCT-ND; URL: http://www.digikey.ca/product-detail/en/CRCW08055K76FKEA/541-5.76KCCT-ND
footprint RESC2112X05M (Chip Resistor, 2-Leads, Body 2.05x1.25mm, IPC Low Density)
pins: 1, 2

## Resistor_5.76M
designator R?, comment Res3  value 5.76M
RES SMD 5.76M OHM 1% 1/8W 0805; MPN: CRCW08055M76FKEA; Name: Resistor_5.76M; PN: 541-5.76MCCT-ND; URL: http://www.digikey.ca/product-detail/en/CRCW08055M76FKEA/541-5.76MCCT-ND
footprint RESC2112X05M (Chip Resistor, 2-Leads, Body 2.05x1.25mm, IPC Low Density)
pins: 1, 2

## Resistor_5.76R
designator R?, comment Res3  value 5.76R
RES SMD 5.76R OHM 1% 1/8W 0805; MPN: CRCW08055R76FKEA; Name: Resistor_5.76R; PN: 541-5.76CCCT-ND; URL: http://www.digikey.ca/product-detail/en/CRCW08055R76FKEA/541-5.76CCCT-ND
footprint RESC2112X05M (Chip Resistor, 2-Leads, Body 2.05x1.25mm, IPC Low Density)
pins: 1, 2

## Resistor_5.90K
designator R?, comment Res3  value 5.90K
RES SMD 5.90K OHM 1% 1/8W 0805; MPN: CRCW08055K90FKEA; Name: Resistor_5.90K; PN: 541-5.90KCCT-ND; URL: http://www.digikey.ca/product-detail/en/CRCW08055K90FKEA/541-5.90KCCT-ND
footprint RESC2112X05M (Chip Resistor, 2-Leads, Body 2.05x1.25mm, IPC Low Density)
pins: 1, 2

## Resistor_5.90M
designator R?, comment Res3  value 5.90M
RES SMD 5.90M OHM 1% 1/8W 0805; MPN: CRCW08055M90FKEA; Name: Resistor_5.90M; PN: 541-5.90MCCT-ND; URL: http://www.digikey.ca/product-detail/en/CRCW08055M90FKEA/541-5.90MCCT-ND
footprint RESC2112X05M (Chip Resistor, 2-Leads, Body 2.05x1.25mm, IPC Low Density)
pins: 1, 2

## Resistor_5.90R
designator R?, comment Res3  value 5.90R
RES SMD 5.90R OHM 1% 1/8W 0805; MPN: CRCW08055R90FKEA; Name: Resistor_5.90R; PN: 541-5.90CCCT-ND; URL: http://www.digikey.ca/product-detail/en/CRCW08055R90FKEA/541-5.90CCCT-ND
footprint RESC2112X05M (Chip Resistor, 2-Leads, Body 2.05x1.25mm, IPC Low Density)
pins: 1, 2

## Resistor_6.04K
designator R?, comment Res3  value 6.04K
RES SMD 6.04K OHM 1% 1/8W 0805; MPN: CRCW08056K04FKEA; Name: Resistor_6.04K; PN: 541-6.04KCCT-ND; URL: http://www.digikey.ca/product-detail/en/CRCW08056K04FKEA/541-6.04KCCT-ND
footprint RESC2112X05M (Chip Resistor, 2-Leads, Body 2.05x1.25mm, IPC Low Density)
pins: 1, 2

## Resistor_6.04M
designator R?, comment Res3  value 6.04M
RES SMD 6.04M OHM 1% 1/8W 0805; MPN: CRCW08056M04FKEA; Name: Resistor_6.04M; PN: 541-6.04MCCT-ND; URL: http://www.digikey.ca/product-detail/en/CRCW08056M04FKEA/541-6.04MCCT-ND
footprint RESC2112X05M (Chip Resistor, 2-Leads, Body 2.05x1.25mm, IPC Low Density)
pins: 1, 2

## Resistor_6.04R
designator R?, comment Res3  value 6.04R
RES SMD 6.04R OHM 1% 1/8W 0805; MPN: CRCW08056R04FKEA; Name: Resistor_6.04R; PN: 541-6.04CCCT-ND; URL: http://www.digikey.ca/product-detail/en/CRCW08056R04FKEA/541-6.04CCCT-ND
footprint RESC2112X05M (Chip Resistor, 2-Leads, Body 2.05x1.25mm, IPC Low Density)
pins: 1, 2

## Resistor_6.19K
designator R?, comment Res3  value 6.19K
RES SMD 6.19K OHM 1% 1/8W 0805; MPN: CRCW08056K19FKEA; Name: Resistor_6.19K; PN: 541-6.19KCCT-ND; URL: http://www.digikey.ca/product-detail/en/CRCW08056K19FKEA/541-6.19KCCT-ND
footprint RESC2112X05M (Chip Resistor, 2-Leads, Body 2.05x1.25mm, IPC Low Density)
pins: 1, 2

## Resistor_6.19M
designator R?, comment Res3  value 6.19M
RES SMD 6.19M OHM 1% 1/8W 0805; MPN: CRCW08056M19FKEA; Name: Resistor_6.19M; PN: 541-6.19MCCT-ND; URL: http://www.digikey.ca/product-detail/en/CRCW08056M19FKEA/541-6.19MCCT-ND
footprint RESC2112X05M (Chip Resistor, 2-Leads, Body 2.05x1.25mm, IPC Low Density)
pins: 1, 2

## Resistor_6.19R
designator R?, comment Res3  value 6.19R
RES SMD 6.19R OHM 1% 1/8W 0805; MPN: CRCW08056R19FKEA; Name: Resistor_6.19R; PN: 541-6.19CCCT-ND; URL: http://www.digikey.ca/product-detail/en/CRCW08056R19FKEA/541-6.19CCCT-ND
footprint RESC2112X05M (Chip Resistor, 2-Leads, Body 2.05x1.25mm, IPC Low Density)
pins: 1, 2

## Resistor_6.34K
designator R?, comment Res3  value 6.34K
RES SMD 6.34K OHM 1% 1/8W 0805; MPN: CRCW08056K34FKEA; Name: Resistor_6.34K; PN: 541-6.34KCCT-ND; URL: http://www.digikey.ca/product-detail/en/CRCW08056K34FKEA/541-6.34KCCT-ND
footprint RESC2112X05M (Chip Resistor, 2-Leads, Body 2.05x1.25mm, IPC Low Density)
pins: 1, 2

## Resistor_6.34M
designator R?, comment Res3  value 6.34M
RES SMD 6.34M OHM 1% 1/8W 0805; MPN: CRCW08056M34FKEA; Name: Resistor_6.34M; PN: 541-6.34MCCT-ND; URL: http://www.digikey.ca/product-detail/en/CRCW08056M34FKEA/541-6.34MCCT-ND
footprint RESC2112X05M (Chip Resistor, 2-Leads, Body 2.05x1.25mm, IPC Low Density)
pins: 1, 2

## Resistor_6.34R
designator R?, comment Res3  value 6.34R
RES SMD 6.34R OHM 1% 1/8W 0805; MPN: CRCW08056R34FKEA; Name: Resistor_6.34R; PN: 541-6.34CCCT-ND; URL: http://www.digikey.ca/product-detail/en/CRCW08056R34FKEA/541-6.34CCCT-ND
footprint RESC2112X05M (Chip Resistor, 2-Leads, Body 2.05x1.25mm, IPC Low Density)
pins: 1, 2